# Altium footprint library PcbLib_jp.PcbLib: 255 footprints (part 15 of 16)
Each footprint in its own frame and in the unit in brackets; x right, y up, seen from the top. Pads: shape width x height; smd on the part's side, far side on the other; paste and mask are expansions set on the pad; w line width, h text height; cw(c..) or ccw(c..) is an arc to the next point about the centre after c.
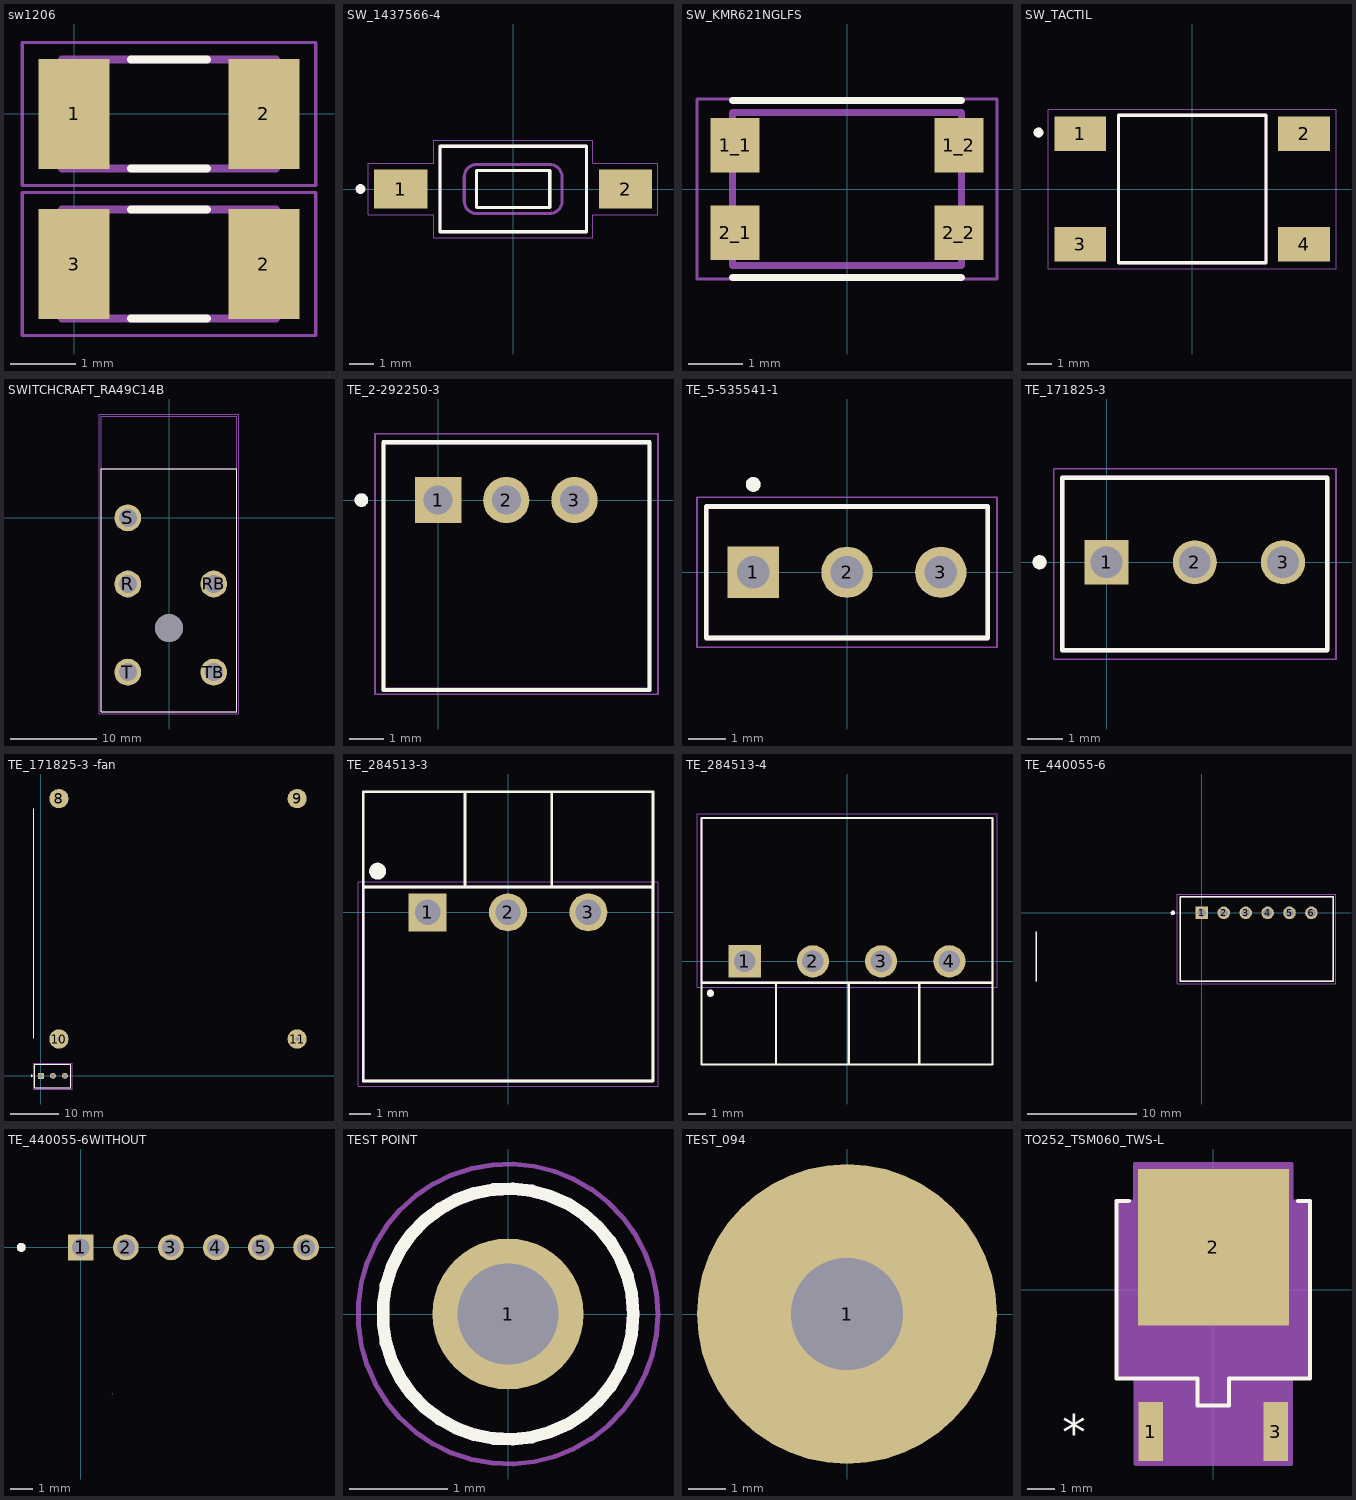
[diagram p14: the footprints below, top view; thin cyan lines are the x and y axes]

## sw1206 [mm]
pads (4):
  rect 1.08x1.68 smd: 1(0,0) 2(2.89,-2.286) 2(2.89,0) 3(0,-2.286)
Top Overlay:
  lines w0.127: 0.865,-3.116 2.025,-3.116 ; 0.865,-1.456 2.025,-1.456 ; 0.865,-0.83 2.025,-0.83 ; 0.865,0.83 2.025,0.83
Mechanical 13:
  lines w0.127: -0.185,-3.116 3.075,-3.116 ; -0.185,-3.116 -0.185,-1.456 ; -0.185,-3.116 3.075,-3.116 ; -0.185,-3.116 -0.185,-1.456 ; -0.185,-1.456 3.075,-1.456 ; -0.185,-1.456 3.075,-1.456 ; -0.185,-0.83 -0.185,0.83 ; -0.185,-0.83 3.075,-0.83 ; -0.185,-0.83 -0.185,0.83 ; -0.185,-0.83 3.075,-0.83 ; -0.185,0.83 3.075,0.83 ; -0.185,0.83 3.075,0.83 ; 3.075,-3.116 3.075,-1.456 ; 3.075,-3.116 3.075,-1.456 ; 3.075,-0.83 3.075,0.83 ; 3.075,-0.83 3.075,0.83
Mechanical 16:
  lines w0.05: -0.792,-3.376 3.682,-3.376 3.682,-1.196 -0.792,-1.196 -0.792,-3.376 ; -0.792,-1.09 -0.792,1.09 3.682,1.09 3.682,-1.09 -0.792,-1.09
3D body "User Library-CR3216-1206.STEP": height 1.6, standoff 1, extent -0.178,-0.8 3.022,0.8
3D body "User Library-CR3216-1206.STEP": height 1.6, standoff 1, extent -0.178,-3.086 3.022,-1.486

## SW_1437566-4 [mm]
pads (2):
  rect 2.18x1.6 smd: 1(-4.6,0) 2(4.6,0)
Top Overlay:
  circle w0.2: c-6.25,0 r0.1
  lines w0.127: -3,-1.75 3,-1.75 3,1.75 -3,1.75 -3,-1.75 ; -1.5,-0.75 1.5,-0.75 1.5,0.75 -1.5,0.75 -1.5,-0.75
Mechanical 13:
  circle w0.2: c-4.6,0 r0.1
  lines w0.127: -3,-1.75 3,-1.75 3,1.75 -3,1.75 -3,-1.75 ; -2,-0.5 ccw(c-1.5,-0.5) -1.5,-1 1.5,-1 ccw(c1.5,-0.5) 2,-0.5 2,0.5 ccw(c1.5,0.5) 1.5,1 -1.5,1 ccw(c-1.5,0.5) -2,0.5 -2,-0.5 ; -1.5,-0.75 1.5,-0.75 1.5,0.75 -1.5,0.75 -1.5,-0.75
Mechanical 15:
  lines w0.05: -5.93,-1.05 -5.93,1.05 -3.25,1.05 -3.25,2 3.25,2 3.25,1.05 5.93,1.05 5.93,-1.05 3.25,-1.05 3.25,-2 -3.25,-2 -3.25,-1.05 -5.93,-1.05
3D body "1437566-4.stp": height 5, standoff 0.59, extent -4.964,-1.63 5.005,1.87

## SW_KMR621NGLFS [mm]
pads (4):
  rect 0.9x1 smd: 1_1(-2.05,0.8) 1_2(2.05,0.8) 2_1(-2.05,-0.8) 2_2(2.05,-0.8)
Top Overlay:
  lines w0.127: -2.1,-1.62 2.1,-1.62 ; -2.1,1.62 2.1,1.62
Mechanical 13:
  lines w0.127: -2.1,-1.4 -2.1,1.4 2.1,1.4 2.1,-1.4 -2.1,-1.4
Mechanical 15:
  lines w0.05: -2.75,-1.65 -2.75,1.65 2.75,1.65 2.75,-1.65 -2.75,-1.65
3D body "KMR621NG LFS--3DModel-STEP-56544.STEP": height 2.5, standoff 0.6, extent -2.31,-1.31 2.29,1.49

## SW_TACTIL [mm]
pads (4):
  rect 2.1x1.4 smd: 1(-4.55,2.25) 2(4.55,2.25) 3(-4.55,-2.25) 4(4.55,-2.25)
Top Overlay:
  circle w0.2: c-6.25,2.3 r0.1
  lines w0.127: -3,-3 -3,3 3,3 3,-3 -3,-3
Mechanical 13:
  circle w0.2: c-6.25,2.3 r0.1
  lines w0.127: -3,-3 3,-3 3,3 -3,3 -3,-3
Mechanical 15:
  lines w0.05: -5.85,-3.25 5.85,-3.25 5.85,3.25 -5.85,3.25 -5.85,-3.25
3D body "User Library-switch.STEP": height 5, standoff 0, extent -4.424,-2.949 4.576,3.051

## SWITCHCRAFT_RA49C14B [mm]
pads (6):
  round 3.096 hole 2.08: R(-4.75,-7.62) RB(5.16,-7.62) S(-4.75,0) T(-4.75,-17.78) TB(5.16,-17.78)
  round 3.25 hole 3.25 unplated: ""(0,-12.7)
Top Overlay:
  lines w0.127: -7.81,-22.36 7.81,-22.36 7.81,5.69 -7.81,5.69 -7.81,-22.36
Top Solder:
  circle w1.879: c0,-12.7 r0.94
Bottom Solder:
  circle w1.879: c0,-12.7 r0.94
Mechanical 13:
  lines w0.127: -7.81,5.69 -7.81,11.73 7.81,11.73 7.81,5.69 ; -7.81,5.69 -7.81,-22.36 7.81,-22.36 7.81,5.69 ; -7.81,5.69 7.81,5.69
  text "PCB EDGE" at -4.5,6.29 h1.27
Mechanical 15:
  lines w0.05: -8.06,-22.61 8.06,-22.61 8.06,11.98 -8.06,11.98 -8.06,-22.61
3D body "RA49C14B--3DModel-STEP-1.STEP": height 15.81, standoff -9.25, extent -7.811,-22.3 7.81,24.328

## TE_2-292250-3 [mm]
pads (3):
  rect 1.358x1.358 hole 0.85: 1(0,0)
  round 1.358 hole 0.85: 2(2,0) 3(4,0)
Top Overlay:
  circle w0.2: c-2.25,0 r0.1
  lines w0.127: -1.6,-5.57 -1.6,1.7 6.2,1.7 6.2,-5.57 -1.6,-5.57
Mechanical 13:
  circle w0.2: c-2.25,0 r0.1
  lines w0.127: -1.6,-5.56 -1.6,1.7 6.2,1.7 6.2,-5.56 -1.6,-5.56
Mechanical 15:
  lines w0.05: -1.85,-5.7 -1.85,1.95 6.45,1.95 6.45,-5.7 -1.85,-5.7
3D body "DF3A-3P-2DS--3DModel-STEP-1.STEP": height 4.7, standoff -3.2, extent -2,-5.45 6,1.75

## TE_5-535541-1 [mm]
pads (3):
  rect 1.388x1.388 hole 0.88: 1(-2.54,0)
  round 1.388 hole 0.88: 2(0,0) 3(2.54,0)
Top Overlay:
  circle w0.2: c-2.54,2.38 r0.1
  lines w0.127: -3.81,-1.78 3.81,-1.78 3.81,1.78 -3.81,1.78 -3.81,-1.78
Mechanical 13:
  circle w0.2: c-2.54,2.38 r0.1
  lines w0.127: -3.81,-1.78 3.81,-1.78 3.81,1.78 -3.81,1.78 -3.81,-1.78
Mechanical 15:
  lines w0.05: -4.06,-2.03 4.06,-2.03 4.06,2.03 -4.06,2.03 -4.06,-2.03
3D body "User Library-Jumper SL2.STEP": height 9.5, standoff -2.6, extent -1.3,-1.3 3.7,1.24

## TE_171825-3 [mm]
pads (3):
  rect 1.25x1.25 hole 0.9: 1(0,0)
  round 1.25 hole 0.9: 2(2.5,0) 3(5,0)
Top Overlay:
  circle w0.2: c-1.9,0 r0.1
  lines w0.127: -1.25,-2.5 -1.25,2.4 6.25,2.4 6.25,-2.5 -1.25,-2.5
Mechanical 13:
  circle w0.2: c-1.9,0 r0.1
  lines w0.127: -1.25,-2.5 -1.25,2.4 6.25,2.4 6.25,-2.5 ; -1.25,-2.5 6.25,-2.5 ; -1.25,-2.5 6.25,-2.5
Mechanical 15:
  lines w0.05: -1.5,-2.75 -1.5,2.65 6.5,2.65 6.5,-2.75 -1.5,-2.75
3D body "171825-3.step": height 10.41, standoff -3.59, extent -1.397,-2.413 6.103,2.487

## TE_171825-3 -fan [mm]
pads (7):
  rect 1.25x1.25 hole 0.9: 1(0,0)
  round 1.25 hole 0.9: 2(2.5,0) 3(5,0)
  round 4 hole 0.762: 8(3.75,57.72) 9(53.35,57.72) 10(3.75,7.66) 11(53.35,7.66)
Top Overlay:
  circle w0.2: c-1.9,0 r0.1
  lines w0.127: -1.5,7.78 -1.5,55.63 ; -1.25,-2.5 -1.25,2.4 6.25,2.4 6.25,-2.5 -1.25,-2.5
Mechanical 13:
  circle w0.2: c-1.9,0 r0.1
  lines w0.127: -1.25,-2.5 -1.25,2.4 6.25,2.4 6.25,-2.5 ; -1.25,-2.5 6.25,-2.5 ; -1.25,-2.5 6.25,-2.5
Mechanical 15:
  lines w0.05: -1.5,-2.75 -1.5,2.65 6.5,2.65 6.5,-2.75 -1.5,-2.75
3D body "171825-3.step": height 10.41, standoff -3.59, extent -1.49,-2.66 6.01,2.24
3D body "612FL_ebm-papst.step": height 15, standoff 0, extent -1.36,2.62 58.64,62.62

## TE_284513-3 [mm]
pads (3):
  rect 1.8x1.8 hole 1.2: 1(-3.81,0)
  round 1.8 hole 1.2: 2(0,0) 3(3.81,0)
Top Overlay:
  circle w0.4: c-6.18,1.95 r0.2
  lines w0.127: -6.86,5.38 -6.86,1.21 -6.83,1.18 ; -6.86,5.39 -6.86,5.72 6.87,5.72 6.87,1.19 ; -6.85,5.7 -6.83,5.7 ; -2.04,1.26 -2.04,5.68 ; 2.07,1.26 2.07,5.68 ; -6.86,-8 -6.86,1.2 6.87,1.2 6.87,-8 -6.86,-8
Mechanical 13:
  lines w0.127: -6.86,-8 6.86,-8 6.86,1.2 -6.86,1.2 -6.86,-8
Mechanical 15:
  lines w0.05: -7.11,-8.25 7.11,-8.25 7.11,1.45 -7.11,1.45 -7.11,-8.25
3D body "284513-3--3DModel-STEP-1.STEP": height 7.3, standoff -3.4, extent -6.86,-8 6.86,1.2

## TE_284513-4 [mm]
pads (4):
  rect 1.8x1.8 hole 1.2: 1(-5.715,0)
  round 1.8 hole 1.2: 2(-1.905,0) 3(1.905,0) 4(5.715,0)
Top Overlay:
  circle w0.2: c-7.63,-1.78 r0.1
  lines w0.127: -8.125,-1.22 -8.125,-5.76 8.125,-5.76 8.125,-1.22 ; -7.035,-1.2 -8.125,-1.2 -8.125,8 8.125,8 8.125,-1.2 7.035,-1.2 ; -6.98,-1.2 7.08,-1.2 ; -3.97,-5.75 -3.97,-1.22 ; 0.1,-5.75 0.1,-1.22 ; 4.04,-5.75 4.04,-1.22
Mechanical 13:
  circle w0.2: c-7.63,-1.8 r0.1
  lines w0.127: -8.125,-1.2 -8.125,8 8.125,8 8.125,-1.2 -8.125,-1.2
Mechanical 15:
  lines w0.05: -8.375,-1.45 8.375,-1.45 8.375,8.25 -8.375,8.25 -8.375,-1.45
3D body "284513-4.stp": height 7.3, standoff -3.4, extent -8.7,-1.3 8.83,7.9

## TE_440055-6 [mm]
pads (6):
  rect 1.15x1.15 hole 0.8: 1(0,0)
  round 1.15 hole 0.8: 2(2.007,0) 3(4.013,0) 4(6.02,0) 5(8.026,0) 6(10.033,0)
Top Overlay:
  circle w0.2: c-2.65,0 r0.1
  lines w0.127: -15.185,-6.27 -15.185,-1.73 ; -2,-6.25 12.033,-6.25 12.033,1.45 -2,1.45 -2,-6.25
Mechanical 13:
  circle w0.2: c-2.65,0 r0.1
  lines w0.127: -2,-6.25 12.033,-6.25 ; -2,-6.25 12.033,-6.25 ; -2,-6.25 -2,1.45 12.033,1.45 12.033,-6.25
Mechanical 15:
  lines w0.05: -2.25,-6.5 12.283,-6.5 12.283,1.7 -2.25,1.7 -2.25,-6.5
3D body "440055-6.step": height 3.47, standoff -4.87, extent -2.11,-6.12 11.89,1.58

## TE_440055-6WITHOUT [mm]
pads (6):
  rect 1.15x1.15 hole 0.8: 1(0,0)
  round 1.15 hole 0.8: 2(2.007,0) 3(4.013,0) 4(6.02,0) 5(8.026,0) 6(10.033,0)
Top Overlay:
  circle w0.2: c-2.65,0 r0.1
Mechanical 13:
  circle w0.2: c-2.65,0 r0.1
Mechanical 15:
  lines w0.05: 1.383,-6.5 1.393,-6.51

## TEST POINT [mm]
pads (1):
  round 1.53 hole 1.02: 1(0,0)
Top Overlay:
  circle w0.127: c0,0 r1.27
Mechanical 13:
  circle w0.127: c0,0 r1.27
  circle w0.127: c0,0 r1.27
Mechanical 16:
  circle w0.05: c0,0 r1.52
3D body "User Library-Test Point Keystone - 5000 RED.STEP": height 4.57, standoff -3.05, extent -1.27,-1.27 1.27,1.27

## TEST_094 [mm]
pads (1):
  round 8 hole 3: 1(0,0)
Top Overlay:
  circle w0.127: c0,0 r1.27
Mechanical 13:
  circle w0.127: c0,0 r1.27
  circle w0.127: c0,0 r1.27
Mechanical 16:
  circle w0.05: c0,0 r1.52

## TO252_TSM060_TWS-L [mil]
pads (3):
  rect 35x85 smd paste+0 mask+0: 1(-90,-204) 3(90,-204)
  rect 217x225 smd paste+0 mask+0: 2(0,61.31)
Top Overlay:
  lines w6: -121.6,127.5 -139,127.5 -139,-127.5 -22.5,-127.5 -22.5,-166.5 22.5,-166.5 22.5,-127.5 139,-127.5 139,127.5 121.6,127.5
  text "*" at -217.5,-229 h50
Mechanical 13:
  lines w1: -134,-122.5 134,-122.5 134,122.5 -134,122.5 -134,-122.5 ; -107.5,-240.5 -107.5,-122.5 -72.5,-122.5 -72.5,-240.5 -107.5,-240.5 ; -17.5,-161.5 -17.5,-122.5 17.5,-122.5 17.5,-161.5 -17.5,-161.5 ; 72.5,-240.5 72.5,-122.5 107.5,-122.5 107.5,-240.5 72.5,-240.5
  text "*" at -102.5,-137.5 h50
Mechanical 15:
  region: -138,-126.5 -138,126.5 -112.5,126.5 -112.5,180.81 112.5,180.81 112.5,126.5 138,126.5 138,-126.5 111.5,-126.5 111.5,-250.5 -111.5,-250.5 -111.5,-126.5
  lines w6: -138,-126.5 -138,126.5 -112.5,126.5 -112.5,180.81 112.5,180.81 112.5,126.5 138,126.5 138,-126.5 111.5,-126.5 111.5,-250.5 -111.5,-250.5 -111.5,-126.5 -138,-126.5
3D body "TO252_TSM060_TWS.step": height 94.09, standoff -2.01, extent -134.02,-240.51 134.02,165.83